# Altium footprint library Socket.PcbLib: 38 footprints (part 1 of 3)
Each footprint in its own frame and in the unit in brackets; x right, y up, seen from the top. Pads: shape width x height; smd on the part's side, far side on the other; paste and mask are expansions set on the pad; w line width, h text height; cw(c..) or ccw(c..) is an arc to the next point about the centre after c.
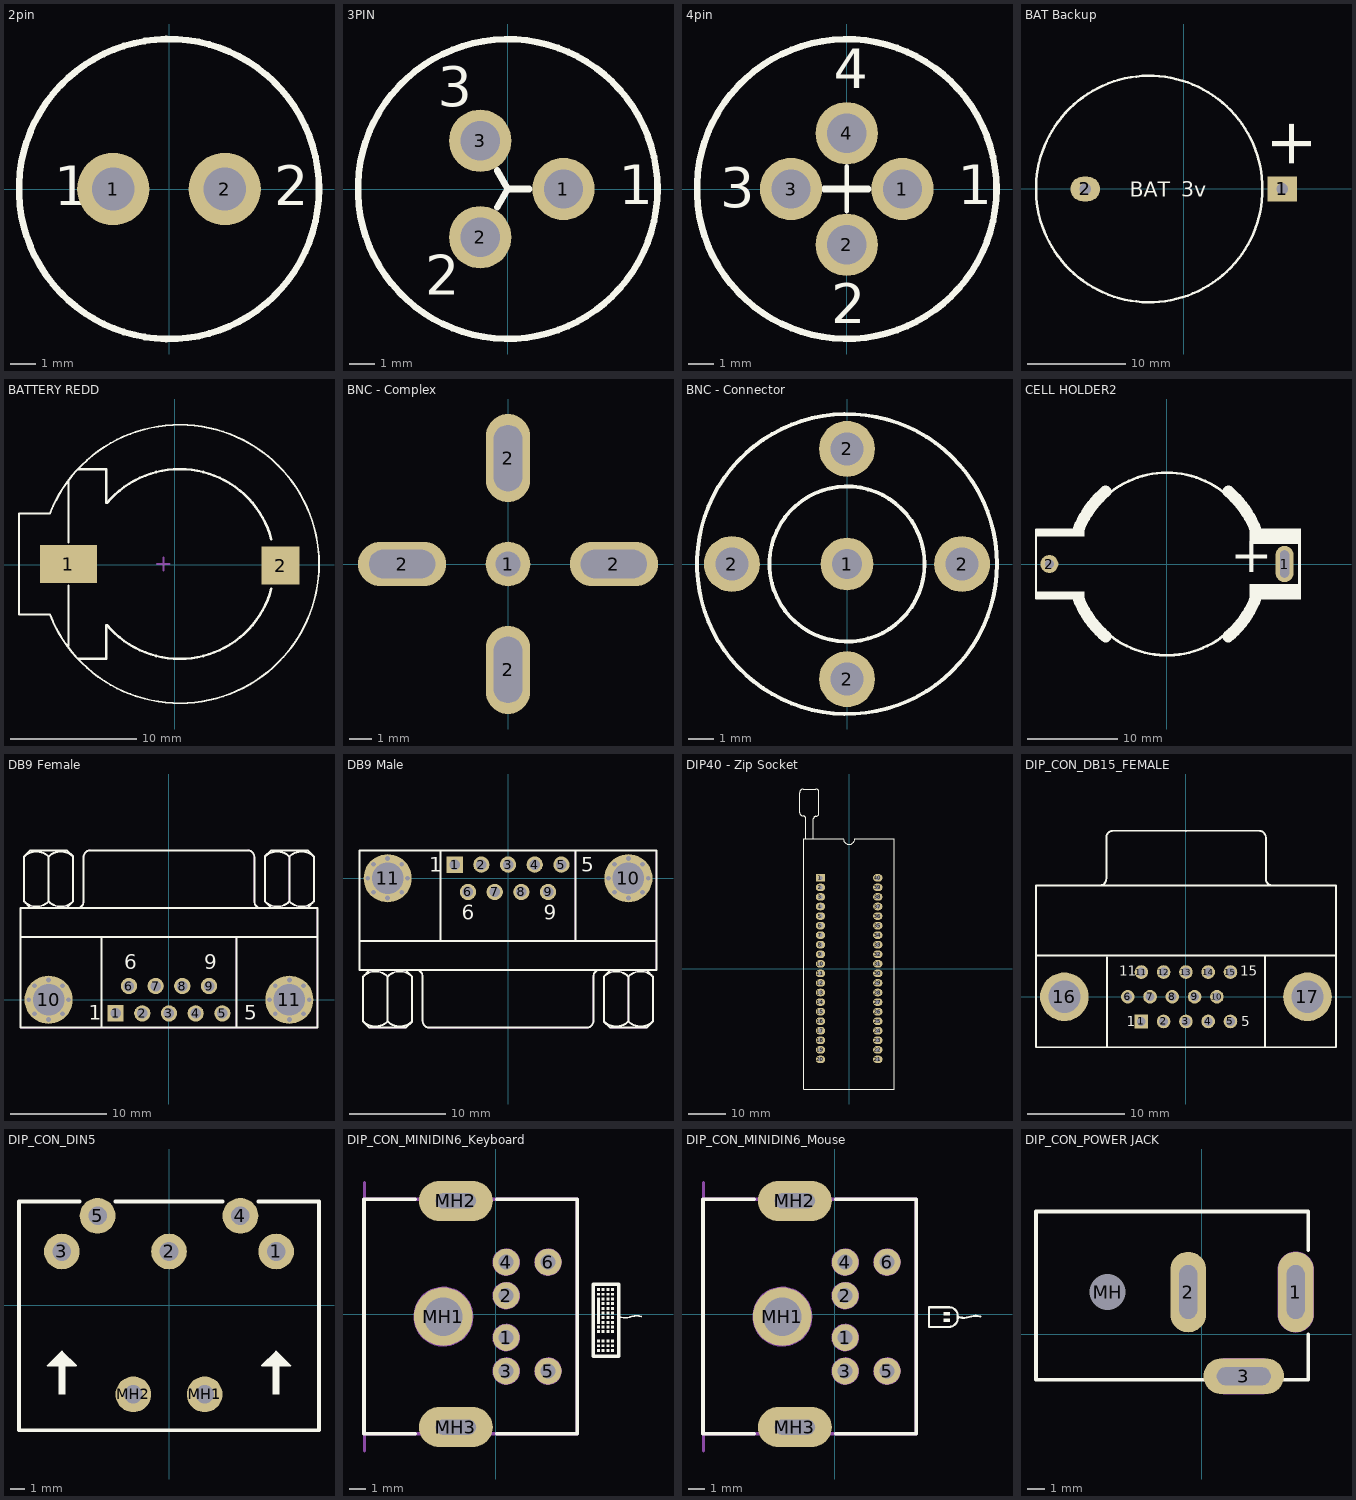
[diagram p0: the footprints below, top view; thin cyan lines are the x and y axes]

## 2pin [mil]
pads (2):
  round 110 hole 65: 1(-85,0) 2(85,0)
Top Overlay:
  circle w10: c0,0 r228.35
  text "2" at 160,-25 h60
  text "1" at -175,-25 h60
3D body "2PIN1.STEP": height 653.54, standoff -86.61, extent -297.24,-297.24 297.24,297.24

## 3PIN [mil]
pads (3):
  round 95 hole 60: 1(85,0) 2(-42,-73.49) 3(-42,73.49)
Top Overlay:
  circle w10: c0,0 r228.35
  lines w10: -16.25,28.43 0,0 ; -16,-28 0,0 ; 33,0 0,0
  text "3" at -106.48,125.98 h60
  text "2" at -126.17,-161.42 h60
  text "1" at 169.11,-23.62 h60
3D body "3pin1.STEP": height 653.54, standoff -86.61, extent -408.01,-408.01 404.07,404.07

## 4pin [mil]
pads (4):
  round 95 hole 60: 1(85,0) 2(0,-85) 3(-85,0) 4(0,85)
Top Overlay:
  circle w10: c0,0 r228.35
  lines w7: 0,-34 0,35
  lines w10: -34,0 33,0
  text "2" at -23.8,-204.72 h60
  text "3" at -193.09,-27.56 h60
  text "4" at -19.87,153.54 h60
  text "1" at 169.11,-23.62 h60
3D body "4PIN1.STEP": height 653.54, standoff -86.61, extent -420.36,-420.36 420.37,420.37

## BAT Backup [mm]
pads (2):
  rect 3x2.5 hole 1.2: 1(10,0)
  oval 3x2.5 hole 1.2: 2(-10,0)
Top Overlay:
  circle w0.254: c-3.5,0 r11.5
  text "3v" at -0.254,-0.762 h1.52
  text "BAT" at -5.461,-0.762 h1.52
  text "+" at 7.466,1.905 h8
3D body "User Library-20mm_coin_holder.STEP": height 9.17, standoff -3, extent -14.705,-11.5 12.709,11.5

## BATTERY REDD [mm] "CELL BATTERY HOLDER 1220 12mm CR1220"
pads (2):
  rect 4.5x3 smd: 1(-8.382,0.064)
  rect 3x3 smd: 2(8.382,-0.064)
Top Overlay:
  lines w0.15: -9.851,4.063 -12.289,4.063 -12.289,-3.936 -9.843,-3.936 ; -9.837,-3.934 ccw(c0.411,0.064) -9.838,4.059 ; -8.389,-6.436 -8.389,-1.636 ; -8.389,1.763 -8.389,6.663
  lines w0.2: -7.589,-7.437 -5.389,-7.437 -5.389,-4.757 ; -7.589,7.564 -5.389,7.564 -5.389,4.884 ; -5.334,-4.757 ccw(c0.411,0.064) 7.655,-1.878 ; -5.334,4.884 cw(c0.411,0.064) 7.655,2.005
Mechanical 15:
  lines w0.15: -1.389,0.064 -0.389,0.064 ; -0.889,-0.436 -0.889,0.563
3D body "User Library-Battery Holder for CR1220 SMD.step": height 4.28, standoff -0.47, extent -9.349,-7.325 9.452,7.424

## BNC - Complex [mm]
pads (5):
  round 2.032 hole 1.143: 1(0,0)
  oval 4x2 hole 1.3 slot 3 at 0 deg: 2(-4.8,0) 2(4.8,0)
  oval 2x4 hole 1.3 slot 3 at 90 deg: 2(0,-4.8) 2(0,4.8)
3D body "BNC_complex.STEP": height 34.79, standoff -4.4, extent -7.061,-7.066 7.061,7.066

## BNC - Connector [mil]
pads (5):
  round 80 hole 45: 1(0,0)
  round 85 hole 50: 2(-175.2,0) 2(0,-175.2) 2(0,175.2) 2(175.2,0)
Top Overlay:
  circle w5.91: c0,0 r228.35
  circle w5.91: c0,0 r118.11
3D body "My BNC Short.STEP": height 538.19, standoff -173.23, extent -218.11,-218.11 218.11,218.11

## CELL HOLDER2 [mm] "Battery Cell Holder"
height 5.5
pads (2):
  oval 2x4 hole 1 slot 3 at 90 deg: 1(13,0)
  round 2 hole 1: 2(-13,0)
Top Overlay:
  rectangle: 14.478,-3.877 14.808,3.898
  region: 9.144,3.899 9.144,2.235 14.808,2.235 14.808,3.899
  region: 14.808,-3.902 14.808,-2.21 9.144,-2.21 9.144,-3.902
  region: -9.144,-3.902 -9.144,-3.048 -14.478,-3.048 -14.478,-3.902
  region: -14.478,3.899 -14.478,3.048 -9.144,3.048 -9.144,3.899
  lines w0.2: -10.425,3.8 -14.478,3.8 -14.478,-3.8 -10.4,-3.8
  lines w0.3: -7.122,-7.161 ccw(c0,0) 7.122,-7.161 ; -6.534,7.701 cw(c0,0) 6.534,7.701
  lines w1.3: -9.801,-3.766 ccw(c0,0) -6.771,-8.025 ; -9.801,3.766 cw(c0,0) -6.793,8.006 ; 6.771,-8.025 ccw(c0,0) 9.801,-3.766 ; 6.793,8.006 cw(c0,0) 9.801,3.766
  text "+" at 11.684,-2.294 h7
3D body "CELL_HOLDER.STEP": height 5.4, standoff -2, extent -14.25,-9.999 14.25,9.999

## DB9 Female [mm] "Connector; D Subminiature AMPLIMITE 2000; 9 Position; Right Angle"
height 12.75
pads (27):
  rect 1.69x1.69 hole 1.09: 1(-5.54,-1.42)
  round 1.69 hole 1.09: 2(-2.77,-1.42) 3(0,-1.42) 4(2.77,-1.42) 5(5.54,-1.42) 6(-4.155,1.42) 7(-1.385,1.42) 8(1.385,1.42) 9(4.155,1.42)
  round 0.8 hole 0.5: 10(-14.555,0) 10(-13.952,-1.457) 10(-13.952,1.457) 10(-12.495,-2.06) 10(-12.495,2.06) 10(-11.038,-1.457) 10(-11.038,1.457) 10(-10.435,0) 11(10.435,0) 11(11.038,-1.457) 11(11.038,1.457) 11(12.495,-2.06) 11(12.495,2.06) 11(13.952,-1.457) 11(13.952,1.457) 11(14.555,0)
  round 5 hole 3.26: 10(-12.495,0) 11(12.495,0)
Top Overlay:
  lines w0.2: -15.4,6.5 15.4,6.5 ; -15.038,14.85 -15.038,10.199 -14.403,9.564 ; -15.038,14.865 -14.403,15.5 -10.593,15.5 -9.958,14.865 ; -12.498,10.199 -12.498,14.85 ; -10.593,9.564 -9.958,10.199 -9.958,14.85 ; -9.958,13.586 -9.958,13.798 ; -9.56,9.505 ccw(c-9.56,10.2) -8.865,10.2 -8.865,14.8 ; -8.86,14.805 cw(c-8.165,14.805) -8.165,15.5 8.165,15.5 cw(c8.165,14.805) 8.86,14.805 ; -7,-2.9 -7,6.5 ; 7,-2.9 7,6.5 ; 8.865,14.8 8.865,10.2 ccw(c9.56,10.2) 9.56,9.505 ; 9.962,14.85 9.962,10.199 10.597,9.564 ; 9.962,14.865 10.597,15.5 14.407,15.5 15.042,14.865 ; 12.502,10.199 12.502,14.85 ; 14.407,9.564 15.042,10.199 15.042,14.85 ; 15.042,13.586 15.042,13.798 ; -15.4,-2.9 -15.4,9.5 15.4,9.5 15.4,-2.9 -15.4,-2.9
  lines w0.203: -15.04,10.197 ccw(c-13.768,11.469) -12.496,10.197 ; -15.038,14.85 cw(c-13.766,13.578) -12.493,14.85 ; -12.502,14.85 cw(c-11.23,13.578) -9.958,14.85 ; -12.5,10.197 ccw(c-11.228,11.469) -9.956,10.197 ; 9.96,10.197 ccw(c11.232,11.469) 12.504,10.197 ; 9.962,14.85 cw(c11.234,13.578) 12.507,14.85 ; 12.498,14.85 cw(c13.77,13.578) 15.042,14.85 ; 12.5,10.197 ccw(c13.772,11.469) 15.044,10.197
  text "1" at -8.334,-2.06 h1.5
  text "5" at 7.795,-2.06 h1.5
  text "9" at 3.66,3.18 h1.5
  text "6" at -4.64,3.18 h1.5
Mechanical 1:
  lines w0.1: -9.56,9.505 ccw(c-9.56,10.2) -8.865,10.2 ; -8.86,14.805 cw(c-8.165,14.805) -8.165,15.5 ; 8.165,15.5 cw(c8.165,14.805) 8.86,14.805 ; 8.865,10.2 ccw(c9.56,10.2) 9.56,9.505
Mechanical 13:
  lines w0.1: -15.4,6.5 15.4,6.5 ; -15.04,10.197 ccw(c-13.768,11.469) -12.496,10.197 ; -15.038,14.865 -14.403,15.5 -10.593,15.5 -9.958,14.865 ; -14.403,9.564 -15.038,10.199 -15.038,14.85 cw(c-13.766,13.578) -12.493,14.85 ; -12.502,14.85 cw(c-11.23,13.578) -9.958,14.85 -9.958,10.199 -10.593,9.564 ; -12.5,10.197 ccw(c-11.228,11.469) -9.956,10.197 ; -12.498,10.199 -12.498,14.85 ; -9.958,13.586 -9.958,13.798 ; -8.865,10.2 -8.865,14.8 ; -8.165,15.5 8.165,15.5 ; -7,-2.9 -7,6.5 ; 7,-2.9 7,6.5 ; 8.865,10.2 8.865,14.8 ; 9.96,10.197 ccw(c11.232,11.469) 12.504,10.197 ; 9.962,14.865 10.597,15.5 14.407,15.5 15.042,14.865 ; 10.597,9.564 9.962,10.199 9.962,14.85 cw(c11.234,13.578) 12.507,14.85 ; 12.498,14.85 cw(c13.77,13.578) 15.042,14.85 15.042,10.199 14.407,9.564 ; 12.5,10.197 ccw(c13.772,11.469) 15.044,10.197 ; 12.502,10.199 12.502,14.85 ; 15.042,13.586 15.042,13.798 ; -15.4,-2.9 -15.4,9.5 15.4,9.5 15.4,-2.9 -15.4,-2.9
3D body "SW3dPS-db9_socket.STEP": height 0.01, standoff -14.99, extent -16.428,12.326 16.572,85.595
3D body "9-PIN_DSUB-1.STEP": height 12.71, standoff -3.01, extent -15.405,-3.454 15.405,15.621

## DB9 Male [mm] "Connector; D Subminiature AMPLIMITE 2000; 9 Position; Right Angle"
height 12.75
pads (27):
  rect 1.69x1.69 hole 1.09: 1(-5.54,1.42)
  round 1.69 hole 1.09: 2(-2.77,1.42) 3(0,1.42) 4(2.77,1.42) 5(5.54,1.42) 6(-4.155,-1.42) 7(-1.385,-1.42) 8(1.385,-1.42) 9(4.155,-1.42)
  round 0.8 hole 0.5: 10(10.435,0) 10(11.038,-1.457) 10(11.038,1.457) 10(12.495,-2.06) 10(12.495,2.06) 10(13.952,-1.457) 10(13.952,1.457) 10(14.555,0) 11(-14.555,0) 11(-13.952,-1.457) 11(-13.952,1.457) 11(-12.495,-2.06) 11(-12.495,2.06) 11(-11.038,-1.457) 11(-11.038,1.457) 11(-10.435,0)
  round 5 hole 3.26: 10(12.495,0) 11(-12.495,0)
Top Overlay:
  lines w0.2: -15.4,-6.5 15.4,-6.5 ; -15.042,-14.865 -14.407,-15.5 -10.597,-15.5 -9.962,-14.865 ; -15.042,-14.85 -15.042,-10.199 -14.407,-9.564 ; -15.042,-13.798 -15.042,-13.586 ; -12.502,-14.85 -12.502,-10.199 ; -10.597,-9.564 -9.962,-10.199 -9.962,-14.85 ; -9.56,-9.505 cw(c-9.56,-10.2) -8.865,-10.2 -8.865,-14.8 ; -8.86,-14.805 ccw(c-8.165,-14.805) -8.165,-15.5 8.165,-15.5 ccw(c8.165,-14.805) 8.86,-14.805 ; -7,-6.5 -7,2.9 ; 7,-6.5 7,2.9 ; 8.865,-14.8 8.865,-10.2 cw(c9.56,-10.2) 9.56,-9.505 ; 9.958,-14.865 10.593,-15.5 14.403,-15.5 15.038,-14.865 ; 9.958,-14.85 9.958,-10.199 10.593,-9.564 ; 9.958,-13.798 9.958,-13.586 ; 12.498,-14.85 12.498,-10.199 ; 14.403,-9.564 15.038,-10.199 15.038,-14.85 ; -15.4,-9.5 15.4,-9.5 15.4,2.9 -15.4,2.9 -15.4,-9.5
  lines w0.203: -15.044,-10.197 cw(c-13.772,-11.469) -12.5,-10.197 ; -15.042,-14.85 ccw(c-13.77,-13.578) -12.498,-14.85 ; -12.507,-14.85 ccw(c-11.234,-13.578) -9.962,-14.85 ; -12.504,-10.197 cw(c-11.232,-11.469) -9.96,-10.197 ; 9.956,-10.197 cw(c11.228,-11.469) 12.5,-10.197 ; 9.958,-14.85 ccw(c11.23,-13.578) 12.502,-14.85 ; 12.493,-14.85 ccw(c13.766,-13.578) 15.038,-14.85 ; 12.496,-10.197 cw(c13.768,-11.469) 15.04,-10.197
  text "9" at 3.7,-4.3 h1.5
  text "5" at 7.6,0.7 h1.5
  text "1" at -8.165,0.7 h1.5
  text "6" at -4.8,-4.3 h1.5
Mechanical 13:
  lines w0.1: -15.4,-6.5 15.4,-6.5 ; -15.044,-10.197 cw(c-13.772,-11.469) -12.5,-10.197 ; -15.042,-14.865 -14.407,-15.5 -10.597,-15.5 -9.962,-14.865 ; -15.042,-13.798 -15.042,-13.586 ; -14.407,-9.564 -15.042,-10.199 -15.042,-14.85 ccw(c-13.77,-13.578) -12.498,-14.85 ; -12.507,-14.85 ccw(c-11.234,-13.578) -9.962,-14.85 -9.962,-10.199 -10.597,-9.564 ; -12.504,-10.197 cw(c-11.232,-11.469) -9.96,-10.197 ; -12.502,-14.85 -12.502,-10.199 ; -9.56,-9.505 cw(c-9.56,-10.2) -8.865,-10.2 -8.865,-14.8 ; -8.86,-14.805 ccw(c-8.165,-14.805) -8.165,-15.5 8.165,-15.5 ccw(c8.165,-14.805) 8.86,-14.805 ; -7,-6.5 -7,2.9 ; 7,-6.5 7,2.9 ; 8.865,-14.8 8.865,-10.2 cw(c9.56,-10.2) 9.56,-9.505 ; 9.956,-10.197 cw(c11.228,-11.469) 12.5,-10.197 ; 9.958,-14.865 10.593,-15.5 14.403,-15.5 15.038,-14.865 ; 9.958,-13.798 9.958,-13.586 ; 10.593,-9.564 9.958,-10.199 9.958,-14.85 ccw(c11.23,-13.578) 12.502,-14.85 ; 12.493,-14.85 ccw(c13.766,-13.578) 15.038,-14.85 15.038,-10.199 14.403,-9.564 ; 12.496,-10.197 cw(c13.768,-11.469) 15.04,-10.197 ; 12.498,-14.85 12.498,-10.199 ; -15.4,-9.5 15.4,-9.5 15.4,2.9 -15.4,2.9 -15.4,-9.5
3D body "9-PIN_DSUB.STEP": height 12.77, standoff -2.95, extent -15.483,-16.188 15.403,3.497

## DIP40 - Zip Socket [mm]
pads (40):
  rect 2.5x2 hole 1.1: 1(-7.62,24.13)
  oval 2.5x2 hole 1.1: 2(-7.62,21.59) 3(-7.62,19.05) 4(-7.62,16.51) 5(-7.62,13.97) 6(-7.62,11.43) 7(-7.62,8.89) 8(-7.62,6.35) 9(-7.62,3.81) 10(-7.62,1.27) 11(-7.62,-1.27) 12(-7.62,-3.81) 13(-7.62,-6.35) 14(-7.62,-8.89) 15(-7.62,-11.43) 16(-7.62,-13.97) 17(-7.62,-16.51) 18(-7.62,-19.05) 19(-7.62,-21.59) 20(-7.62,-24.13) 21(7.62,-24.13) 22(7.62,-21.59) 23(7.62,-19.05) 24(7.62,-16.51) 25(7.62,-13.97) 26(7.62,-11.43) 27(7.62,-8.89) 28(7.62,-6.35) 29(7.62,-3.81) 30(7.62,-1.27) 31(7.62,1.27) 32(7.62,3.81) 33(7.62,6.35) 34(7.62,8.89) 35(7.62,11.43) 36(7.62,13.97) 37(7.62,16.51) 38(7.62,19.05) 39(7.62,21.59) 40(7.62,24.13)
Top Overlay:
  lines w0.2: -11.557,34.5 -11.557,39.903 ccw(c-12.243,39.903) -12.243,40.589 cw(c-12.243,41.478) -13.132,41.478 -13.132,46.812 cw(c-12.198,46.812) -12.198,47.746 -8.808,47.746 cw(c-8.808,46.965) -8.026,46.965 -8.026,41.269 cw(c-8.808,41.269) -8.808,40.488 ccw(c-8.808,39.795) -9.5,39.795 -9.5,34.5 ; -12,-32 -12,34.5 -1.5,34.5 ccw(c0,34.5) 1.5,34.5 12,34.5 12,-32 -12,-32
3D body "Zif-Zip Socket.STEP": height 21.97, standoff -2.52, extent -12.975,-31.475 11.501,41.611

## DIP_CON_DB15_FEMALE [mm] "DB15 VGA connector"
height 14.5
pads (17):
  rect 1.4x1.4 hole 0.9: 1(-4.58,-2.54)
  round 1.4 hole 0.9: 2(-2.29,-2.54) 3(0,-2.54) 4(2.29,-2.54) 5(4.58,-2.54) 6(-5.98,0) 7(-3.69,0) 8(-1.4,0) 9(0.89,0) 10(3.18,0) 11(-4.58,2.54) 12(-2.29,2.54) 13(0,2.54) 14(2.29,2.54) 15(4.58,2.54)
  round 5 hole 3.3: 16(-12.495,0) 17(12.495,0)
Top Overlay:
  lines w0.2: -15.41,4.23 15.43,4.23 ; -8.88,11.435 ccw(c-8.88,12.13) -8.185,12.13 -8.185,16.37 cw(c-7.49,16.37) -7.49,17.065 0.015,17.05 7.52,17.065 cw(c7.52,16.37) 8.215,16.37 ; -8.115,-5.19 -8.115,4.03 ; 8.145,-5.19 8.145,4.11 ; 8.215,12.13 8.215,16.37 ; 8.215,12.13 ccw(c8.91,12.13) 8.91,11.435 ; -15.41,-5.19 -15.41,11.43 15.43,11.43 15.43,-5.19 -15.41,-5.19
  text "15" at 5.58,2.159 h1
  text "5" at 5.707,-3.048 h1
  text "11" at -6.866,2.159 h1
  text "1" at -6.104,-3.048 h1
3D body "DB15 Analog RGB.stp": height 12.75, standoff -3.75, extent -15.515,-4.212 15.485,18.288
3D body "SW3dPS-vga connector.STEP": height 14.3, standoff -0.79, extent -16.725,25.146 16.963,70.276

## DIP_CON_DIN5 [mm]
height 21.5
pads (7):
  round 2.5 hole 1.3: 1(7.5,3.75) 2(0,3.75) 3(-7.5,3.75) 4(5,6.25) 5(-5,6.25) MH1(2.5,-6.25) MH2(-2.5,-6.25)
Top Overlay:
  rectangle: -7.75,-6.25 -7.25,-4.25
  region: 7.75,-4.25 7.25,-4.25 7.25,-6.25 7.75,-6.25
  region: -8.5,-4.25 -7.5,-3.25 -6.5,-4.25
  region: 8.5,-4.25 7.5,-3.25 6.5,-4.25
  lines w0.127: -8.5,-4.25 -7.5,-3.25 -6.5,-4.25 -8.5,-4.25 ; 6.5,-4.25 7.5,-3.25 8.5,-4.25 6.5,-4.25
  lines w0.254: -6.25,7.25 -10.5,7.25 -10.5,-8.75 10.5,-8.75 10.5,7.25 6.25,7.25 ; -3.75,7.25 3.75,7.25
3D body "5PINDIN.STEP": height 21.4, standoff -3.5, extent -10.34,-8.95 10.36,6.05
3D body "pin.stp": height 12.87, standoff -2.91, extent 0.428,5.764 5.72,7.313
3D body: height 13.2, standoff 12, extent 0.39,4.64 0.921,6.74
3D body: height 13.2, standoff 12, extent -0.89,4.62 -0.359,6.72
3D body "pin.stp": height 12.87, standoff -2.91, extent -5.72,5.087 -0.428,6.636

## DIP_CON_MINIDIN6_Keyboard [mm] "PS2 Conector-Keyboard"
height 13
pads (9):
  round 1.6 hole 0.9: 1(0.625,-1.405) 2(0.625,1.095) 3(0.625,-3.405) 4(0.625,3.095) 5(3.125,-3.405) 6(3.125,3.095)
  round 3.5 hole 2.3: MH1(-3.125,-0.155)
  oval 4.4x2.4 hole 0.9 slot 2.4 at 0 deg: MH2(-2.375,6.75) MH3(-2.375,-6.75)
Top Overlay:
  region: 6.048,1.547 6.048,1.369 6.226,1.369 6.226,1.547
  region: 6.048,1.267 6.048,1.09 6.226,1.09 6.226,1.267
  region: 6.048,-0.968 6.048,-1.146 6.226,-1.146 6.226,-0.968
  region: 6.048,-1.527 6.048,-1.704 6.226,-1.704 6.226,-1.527
  region: 6.048,-1.806 6.048,-1.984 6.226,-1.984 6.226,-1.806
  region: 6.048,-2.085 6.048,-2.263 6.226,-2.263 6.226,-2.085
  rectangle: 6.327,1.369 6.505,1.547
  rectangle: 6.607,1.369 6.785,1.547
  rectangle: 6.886,1.369 7.064,1.547
  region: 6.327,1.267 6.327,1.09 6.505,1.09 6.505,1.267
  region: 6.327,0.988 6.327,0.81 6.505,0.81 6.505,0.988
  region: 6.327,0.709 6.327,0.531 6.505,0.531 6.505,0.709
  region: 6.327,0.429 6.327,0.251 6.505,0.251 6.505,0.429
  region: 6.327,0.15 6.327,-0.028 6.505,-0.028 6.505,0.15
  region: 6.327,-0.13 6.327,-0.307 6.505,-0.307 6.505,-0.13
  region: 6.327,-0.409 6.327,-0.587 6.505,-0.587 6.505,-0.409
  region: 6.327,-0.688 6.327,-0.866 6.505,-0.866 6.505,-0.688
  region: 6.327,-0.968 6.327,-1.146 6.505,-1.146 6.505,-0.968
  region: 6.327,-1.527 6.327,-1.704 6.505,-1.704 6.505,-1.527
  region: 6.327,-1.806 6.327,-1.984 6.505,-1.984 6.505,-1.806
  region: 6.327,-2.085 6.327,-2.263 6.505,-2.263 6.505,-2.085
  region: 6.607,1.267 6.607,1.09 6.785,1.09 6.785,1.267
  region: 6.607,0.988 6.607,0.81 6.785,0.81 6.785,0.988
  region: 6.607,0.709 6.607,0.531 6.785,0.531 6.785,0.709
  region: 6.607,0.429 6.607,0.251 6.785,0.251 6.785,0.429
  region: 6.607,0.15 6.607,-0.028 6.785,-0.028 6.785,0.15
  region: 6.607,-0.13 6.607,-0.307 6.785,-0.307 6.785,-0.13
  region: 6.607,-0.409 6.607,-0.587 6.785,-0.587 6.785,-0.409
  region: 6.607,-0.688 6.607,-0.866 6.785,-0.866 6.785,-0.688
  region: 6.607,-0.968 6.607,-1.146 6.785,-1.146 6.785,-0.968
  region: 6.607,-1.527 6.607,-1.704 6.785,-1.704 6.785,-1.527
  region: 6.607,-1.806 6.607,-1.984 6.785,-1.984 6.785,-1.806
  region: 6.607,-2.085 6.607,-2.263 6.785,-2.263 6.785,-2.085
  region: 6.886,1.267 6.886,1.09 7.064,1.09 7.064,1.267
  region: 6.886,0.988 6.886,0.81 7.064,0.81 7.064,0.988
  region: 6.886,0.709 6.886,0.531 7.064,0.531 7.064,0.709
  region: 6.886,0.429 6.886,0.251 7.064,0.251 7.064,0.429
  region: 6.886,0.15 6.886,-0.028 7.064,-0.028 7.064,0.15
  region: 6.886,-0.13 6.886,-0.307 7.064,-0.307 7.064,-0.13
  region: 6.886,-0.409 6.886,-0.587 7.064,-0.587 7.064,-0.409
  region: 6.886,-0.688 6.886,-0.866 7.064,-0.866 7.064,-0.688
  region: 6.886,-0.968 6.886,-1.146 7.064,-1.146 7.064,-0.968
  region: 6.886,-1.527 6.886,-1.704 7.064,-1.704 7.064,-1.527
  region: 6.886,-1.806 6.886,-1.984 7.064,-1.984 7.064,-1.806
  region: 6.886,-2.085 6.886,-2.263 7.064,-2.263 7.064,-2.085
  region: 6.048,-0.688 6.048,-0.866 6.226,-0.866 6.226,-0.688
  region: 6.048,0.988 6.048,-0.587 6.226,-0.587 6.226,0.988
  lines w0.102: 7.343,-0.155 ccw(c7.718,0.722) 8.014,-0.184 cw(c8.389,-1.062) 8.685,-0.155
  lines w0.2: -7.875,-7.155 -7.875,6.845 ; -4.792,-7.155 -7.825,-7.155 -7.825,6.845 -4.792,6.845 ; 0.064,-7.155 4.875,-7.155 4.875,6.845 0.064,6.845
  lines w0.203: 5.819,-2.517 5.819,1.775 7.343,1.775 7.343,-2.517 5.819,-2.517
Mechanical 7:
  circle w0.2: c3.125,3.095 r0.725
  circle w0.2: c3.125,-3.405 r0.725
  circle w0.2: c0.625,-3.405 r0.725
  circle w0.2: c0.625,-1.405 r0.725
  circle w0.2: c0.625,1.095 r0.725
  circle w0.2: c0.625,3.095 r0.725
  circle w0.2: c-3.125,-0.155 r1.697
  lines w0.2: -7.825,-8.156 -7.825,-7.155 ; -7.825,7.846 -7.825,6.845 ; -7.825,-7.155 -7.825,6.845 ; -7.825,-7.155 -7.825,6.845 ; -7.875,-7.155 4.875,-7.155 4.875,6.845 -7.875,6.845 -7.875,-7.155
  text "PCB Edge" at -6.682,-6.886 h0.8
3D body "kyassps2.stp": height 7.64, standoff -14.22, extent -109.322,-7.251 -5.158,6.35
3D body "Mini DIN - 6 Way - Purple.stp": height 13, standoff -3.2, extent -7.927,-7.18 4.873,6.82

## DIP_CON_MINIDIN6_Mouse [mm] "PS2 Connector-Mouse"
height 13
pads (9):
  round 1.6 hole 0.9: 1(0.625,-1.405) 2(0.625,1.095) 3(0.625,-3.405) 4(0.625,3.095) 5(3.125,-3.405) 6(3.125,3.095)
  round 3.5 hole 2.3: MH1(-3.125,-0.155)
  oval 4.4x2.4 hole 0.9 slot 2.4 at 0 deg: MH2(-2.375,6.75) MH3(-2.375,-6.75)
Top Overlay:
  region: 6.48,0.124 6.48,-0.104 6.886,-0.104 6.886,0.124
  region: 6.886,-0.485 6.886,-0.257 6.48,-0.257 6.48,-0.485
  lines w0.127: 6.823,-0.765 ccw(c6.823,-0.244) 7.344,-0.244 7.344,-0.13 ; 6.823,0.404 cw(c6.823,-0.117) 7.344,-0.117 ; 6.835,-0.765 5.616,-0.765 5.616,0.404 6.835,0.404 ; 7.343,-0.155 ccw(c7.718,0.722) 8.014,-0.184 cw(c8.389,-1.062) 8.685,-0.155
  lines w0.2: -7.875,-7.155 -7.875,6.845 ; -4.792,-7.155 -7.825,-7.155 -7.825,6.845 -4.792,6.845 ; 0.064,-7.155 4.875,-7.155 4.875,6.845 0.064,6.845
Mechanical 7:
  circle w0.2: c3.125,3.095 r0.725
  circle w0.2: c3.125,-3.405 r0.725
  circle w0.2: c0.625,-3.405 r0.725
  circle w0.2: c0.625,-1.405 r0.725
  circle w0.2: c0.625,1.095 r0.725
  circle w0.2: c0.625,3.095 r0.725
  circle w0.2: c-3.125,-0.155 r1.697
  lines w0.2: -7.825,-8.156 -7.825,-7.155 ; -7.825,7.846 -7.825,6.845 ; -7.825,-7.155 -7.825,6.845 ; -7.825,-7.155 -7.825,6.845 ; -7.875,-7.155 4.875,-7.155 4.875,6.845 -7.875,6.845 -7.875,-7.155
  text "PCB Edge" at -6.682,-6.886 h0.8
3D body "ps2assy.stp": height 7.64, standoff -14.17, extent -107.671,-6.803 -5.158,6.697
3D body "Mini DIN - 6 Way - Purple.stp": height 13, standoff -3.2, extent -7.927,-7.18 4.873,6.82

## DIP_CON_POWER JACK [mm] "Power Adaptor Jack"
height 11
pads (4):
  oval 2x4.5 hole 1 slot 3 at 90 deg: 1(5.25,2.35) 2(-0.75,2.35)
  oval 4.5x2 hole 1 slot 3 at 0 deg: 3(2.35,-2.35)
  round 1.9 hole 2: MH(-5.25,2.35)
Top Overlay:
  lines w0.2: 0.15,-2.55 -9.25,-2.55 -9.25,6.85 5.95,6.85 5.95,4.7 ; 4.55,-2.55 5.95,-2.55 5.95,0
Mechanical 2:
  lines w2.016: 1.35,-2.35 3.35,-2.35 ; 5.25,1.1 5.25,3.6
3D body "SW3dPS-PowerJack-2.5x5.7mm.STEP": height 11, standoff -3.5, extent -9.25,-2.55 5.95,6.85